# Altium footprint library CONN_HDR_1.00MM_ST_SMD.PcbLib: 42 footprints (part 2 of 3)
Each footprint in its own frame and in the unit in brackets; x right, y up, seen from the top. Pads: shape width x height; smd on the part's side, far side on the other; paste and mask are expansions set on the pad; w line width, h text height; cw(c..) or ccw(c..) is an arc to the next point about the centre after c.
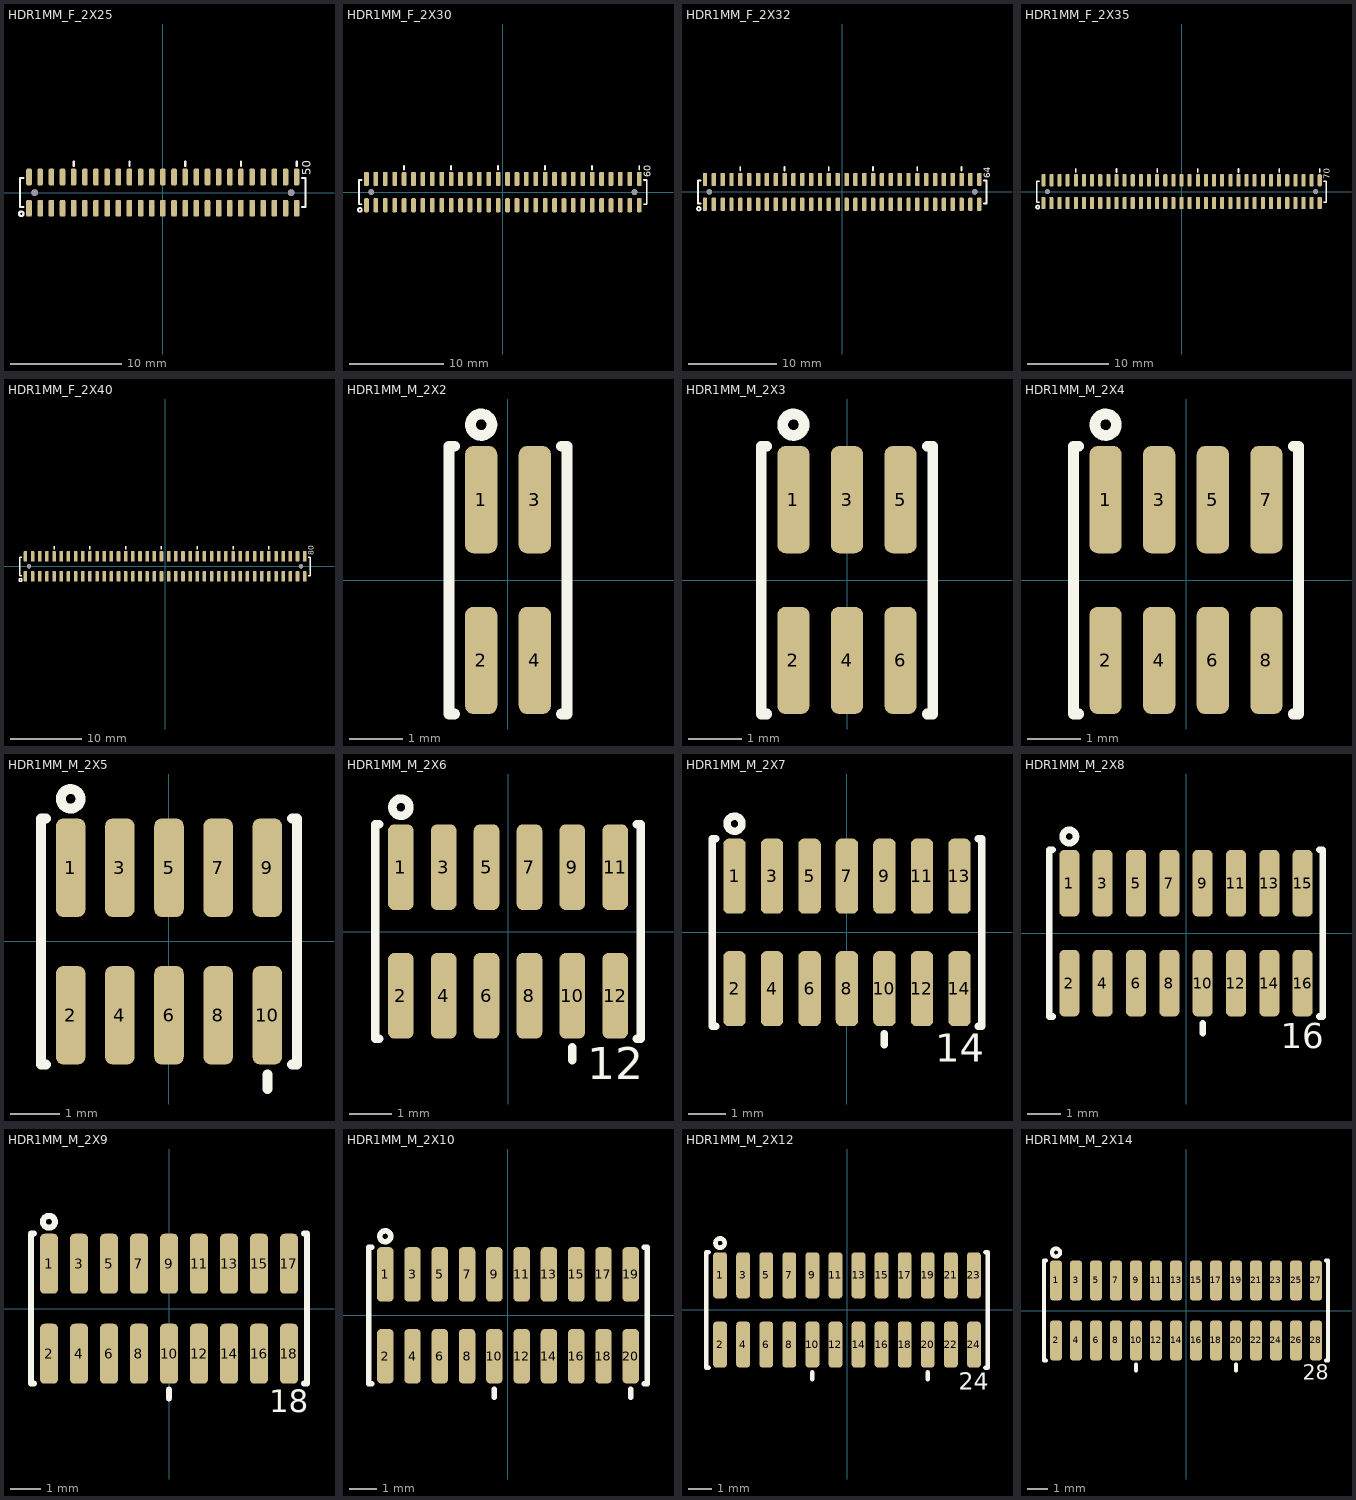
[diagram p1: the footprints below, top view; thin cyan lines are the x and y axes]

## HDR1MM_F_2X25 [mm] "HEADER, 1mm, SMD, GCT CO BC084 and BC085"
pads (52):
  rrect50% 0.5x1.5 smd mask+0.075: 1(-12,-1.4) 2(-12,1.4) 3(-11,-1.4) 4(-11,1.4) 5(-10,-1.4) 6(-10,1.4) 7(-9,-1.4) 8(-9,1.4) 9(-8,-1.4) 10(-8,1.4) 11(-7,-1.4) 12(-7,1.4) 13(-6,-1.4) 14(-6,1.4) 15(-5,-1.4) 16(-5,1.4) 17(-4,-1.4) 18(-4,1.4) 19(-3,-1.4) 20(-3,1.4) 21(-2,-1.4) 22(-2,1.4) 23(-1,-1.4) 24(-1,1.4) 25(0,-1.4) 26(0,1.4) 27(1,-1.4) 28(1,1.4) 29(2,-1.4) 30(2,1.4) 31(3,-1.4) 32(3,1.4) 33(4,-1.4) 34(4,1.4) 35(5,-1.4) 36(5,1.4) 37(6,-1.4) 38(6,1.4) 39(7,-1.4) 40(7,1.4) 41(8,-1.4) 42(8,1.4) 43(9,-1.4) 44(9,1.4) 45(10,-1.4) 46(10,1.4) 47(11,-1.4) 48(11,1.4) 49(12,-1.4) 50(12,1.4)
  round 0.6 hole 0.6 unplated: ""(-11.5,0) ""(11.5,0)
Top Overlay:
  circle w0.2: c-12.7,-1.9 r0.2
  lines w0.2: -12.5,-1.3 -12.8,-1.3 -12.8,1.3 -12.5,1.3 ; -8,2.4 -8,2.8 ; -3,2.4 -3,2.8 ; 2,2.4 2,2.8 ; 7,2.4 7,2.8 ; 12,2.4 12,2.8 ; 12.5,-1.3 12.8,-1.3 12.8,1.3 12.5,1.3
  text "50" at 13.25,1.55 h0.75
3D body "BC084-50-A-0390-L-C.stp": height 2.3, standoff -0.5, extent -12.75,-1.95 12.75,1.95

## HDR1MM_F_2X30 [mm] "HEADER, 1mm, SMD, GCT CO BC084 and BC085"
pads (62):
  rrect50% 0.5x1.5 smd mask+0.075: 1(-14.5,-1.4) 2(-14.5,1.4) 3(-13.5,-1.4) 4(-13.5,1.4) 5(-12.5,-1.4) 6(-12.5,1.4) 7(-11.5,-1.4) 8(-11.5,1.4) 9(-10.5,-1.4) 10(-10.5,1.4) 11(-9.5,-1.4) 12(-9.5,1.4) 13(-8.5,-1.4) 14(-8.5,1.4) 15(-7.5,-1.4) 16(-7.5,1.4) 17(-6.5,-1.4) 18(-6.5,1.4) 19(-5.5,-1.4) 20(-5.5,1.4) 21(-4.5,-1.4) 22(-4.5,1.4) 23(-3.5,-1.4) 24(-3.5,1.4) 25(-2.5,-1.4) 26(-2.5,1.4) 27(-1.5,-1.4) 28(-1.5,1.4) 29(-0.5,-1.4) 30(-0.5,1.4) 31(0.5,-1.4) 32(0.5,1.4) 33(1.5,-1.4) 34(1.5,1.4) 35(2.5,-1.4) 36(2.5,1.4) 37(3.5,-1.4) 38(3.5,1.4) 39(4.5,-1.4) 40(4.5,1.4) 41(5.5,-1.4) 42(5.5,1.4) 43(6.5,-1.4) 44(6.5,1.4) 45(7.5,-1.4) 46(7.5,1.4) 47(8.5,-1.4) 48(8.5,1.4) 49(9.5,-1.4) 50(9.5,1.4) 51(10.5,-1.4) 52(10.5,1.4) 53(11.5,-1.4) 54(11.5,1.4) 55(12.5,-1.4) 56(12.5,1.4) 57(13.5,-1.4) 58(13.5,1.4) 59(14.5,-1.4) 60(14.5,1.4)
  round 0.6 hole 0.6 unplated: ""(-14,0) ""(14,0)
Top Overlay:
  circle w0.2: c-15.2,-1.9 r0.2
  lines w0.2: -15,-1.3 -15.3,-1.3 -15.3,1.3 -15,1.3 ; -10.5,2.4 -10.5,2.8 ; -5.5,2.4 -5.5,2.8 ; -0.5,2.4 -0.5,2.8 ; 4.5,2.4 4.5,2.8 ; 9.5,2.4 9.5,2.8 ; 14.5,2.4 14.5,2.8 ; 15,-1.3 15.3,-1.3 15.3,1.3 15,1.3
  text "60" at 15.75,1.55 h0.75
3D body "BC084-60-A-0390-L-C.stp": height 2.3, standoff -0.5, extent -15.25,-1.95 15.25,1.95

## HDR1MM_F_2X32 [mm] "HEADER, 1mm, SMD, GCT CO BC084 and BC085"
pads (66):
  rrect50% 0.5x1.5 smd mask+0.075: 1(-15.5,-1.4) 2(-15.5,1.4) 3(-14.5,-1.4) 4(-14.5,1.4) 5(-13.5,-1.4) 6(-13.5,1.4) 7(-12.5,-1.4) 8(-12.5,1.4) 9(-11.5,-1.4) 10(-11.5,1.4) 11(-10.5,-1.4) 12(-10.5,1.4) 13(-9.5,-1.4) 14(-9.5,1.4) 15(-8.5,-1.4) 16(-8.5,1.4) 17(-7.5,-1.4) 18(-7.5,1.4) 19(-6.5,-1.4) 20(-6.5,1.4) 21(-5.5,-1.4) 22(-5.5,1.4) 23(-4.5,-1.4) 24(-4.5,1.4) 25(-3.5,-1.4) 26(-3.5,1.4) 27(-2.5,-1.4) 28(-2.5,1.4) 29(-1.5,-1.4) 30(-1.5,1.4) 31(-0.5,-1.4) 32(-0.5,1.4) 33(0.5,-1.4) 34(0.5,1.4) 35(1.5,-1.4) 36(1.5,1.4) 37(2.5,-1.4) 38(2.5,1.4) 39(3.5,-1.4) 40(3.5,1.4) 41(4.5,-1.4) 42(4.5,1.4) 43(5.5,-1.4) 44(5.5,1.4) 45(6.5,-1.4) 46(6.5,1.4) 47(7.5,-1.4) 48(7.5,1.4) 49(8.5,-1.4) 50(8.5,1.4) 51(9.5,-1.4) 52(9.5,1.4) 53(10.5,-1.4) 54(10.5,1.4) 55(11.5,-1.4) 56(11.5,1.4) 57(12.5,-1.4) 58(12.5,1.4) 59(13.5,-1.4) 60(13.5,1.4) 61(14.5,-1.4) 62(14.5,1.4) 63(15.5,-1.4) 64(15.5,1.4)
  round 0.6 hole 0.6 unplated: ""(-15,0) ""(15,0)
Top Overlay:
  circle w0.2: c-16.2,-1.9 r0.2
  lines w0.2: -16,-1.3 -16.3,-1.3 -16.3,1.3 -16,1.3 ; -11.5,2.4 -11.5,2.8 ; -6.5,2.4 -6.5,2.8 ; -1.5,2.4 -1.5,2.8 ; 3.5,2.4 3.5,2.8 ; 8.5,2.4 8.5,2.8 ; 13.5,2.4 13.5,2.8 ; 16,-1.3 16.3,-1.3 16.3,1.3 16,1.3
  text "64" at 16.75,1.55 h0.75
3D body "BC084-64-A-0390-L-C.stp": height 2.3, standoff -0.5, extent -16.25,-1.95 16.25,1.95

## HDR1MM_F_2X35 [mm] "HEADER, 1mm, SMD, GCT CO BC084 and BC085"
pads (72):
  rrect50% 0.5x1.5 smd mask+0.075: 1(-17,-1.4) 2(-17,1.4) 3(-16,-1.4) 4(-16,1.4) 5(-15,-1.4) 6(-15,1.4) 7(-14,-1.4) 8(-14,1.4) 9(-13,-1.4) 10(-13,1.4) 11(-12,-1.4) 12(-12,1.4) 13(-11,-1.4) 14(-11,1.4) 15(-10,-1.4) 16(-10,1.4) 17(-9,-1.4) 18(-9,1.4) 19(-8,-1.4) 20(-8,1.4) 21(-7,-1.4) 22(-7,1.4) 23(-6,-1.4) 24(-6,1.4) 25(-5,-1.4) 26(-5,1.4) 27(-4,-1.4) 28(-4,1.4) 29(-3,-1.4) 30(-3,1.4) 31(-2,-1.4) 32(-2,1.4) 33(-1,-1.4) 34(-1,1.4) 35(0,-1.4) 36(0,1.4) 37(1,-1.4) 38(1,1.4) 39(2,-1.4) 40(2,1.4) 41(3,-1.4) 42(3,1.4) 43(4,-1.4) 44(4,1.4) 45(5,-1.4) 46(5,1.4) 47(6,-1.4) 48(6,1.4) 49(7,-1.4) 50(7,1.4) 51(8,-1.4) 52(8,1.4) 53(9,-1.4) 54(9,1.4) 55(10,-1.4) 56(10,1.4) 57(11,-1.4) 58(11,1.4) 59(12,-1.4) 60(12,1.4) 61(13,-1.4) 62(13,1.4) 63(14,-1.4) 64(14,1.4) 65(15,-1.4) 66(15,1.4) 67(16,-1.4) 68(16,1.4) 69(17,-1.4) 70(17,1.4)
  round 0.6 hole 0.6 unplated: ""(-16.5,0) ""(16.5,0)
Top Overlay:
  circle w0.2: c-17.7,-1.9 r0.2
  lines w0.2: -17.5,-1.3 -17.8,-1.3 -17.8,1.3 -17.5,1.3 ; -13,2.4 -13,2.8 ; -8,2.4 -8,2.8 ; -3,2.4 -3,2.8 ; 2,2.4 2,2.8 ; 7,2.4 7,2.8 ; 12,2.4 12,2.8 ; 17,2.4 17,2.8 ; 17.5,-1.3 17.8,-1.3 17.8,1.3 17.5,1.3
  text "70" at 18.25,1.55 h0.75
3D body "BC084-70-A-0390-L-C.stp": height 2.3, standoff -0.5, extent -17.75,-1.95 17.75,1.95

## HDR1MM_F_2X40 [mm] "HEADER, 1mm, SMD, GCT CO BC084 and BC085"
pads (82):
  rrect50% 0.5x1.5 smd mask+0.075: 1(-19.5,-1.4) 2(-19.5,1.4) 3(-18.5,-1.4) 4(-18.5,1.4) 5(-17.5,-1.4) 6(-17.5,1.4) 7(-16.5,-1.4) 8(-16.5,1.4) 9(-15.5,-1.4) 10(-15.5,1.4) 11(-14.5,-1.4) 12(-14.5,1.4) 13(-13.5,-1.4) 14(-13.5,1.4) 15(-12.5,-1.4) 16(-12.5,1.4) 17(-11.5,-1.4) 18(-11.5,1.4) 19(-10.5,-1.4) 20(-10.5,1.4) 21(-9.5,-1.4) 22(-9.5,1.4) 23(-8.5,-1.4) 24(-8.5,1.4) 25(-7.5,-1.4) 26(-7.5,1.4) 27(-6.5,-1.4) 28(-6.5,1.4) 29(-5.5,-1.4) 30(-5.5,1.4) 31(-4.5,-1.4) 32(-4.5,1.4) 33(-3.5,-1.4) 34(-3.5,1.4) 35(-2.5,-1.4) 36(-2.5,1.4) 37(-1.5,-1.4) 38(-1.5,1.4) 39(-0.5,-1.4) 40(-0.5,1.4) 41(0.5,-1.4) 42(0.5,1.4) 43(1.5,-1.4) 44(1.5,1.4) 45(2.5,-1.4) 46(2.5,1.4) 47(3.5,-1.4) 48(3.5,1.4) 49(4.5,-1.4) 50(4.5,1.4) 51(5.5,-1.4) 52(5.5,1.4) 53(6.5,-1.4) 54(6.5,1.4) 55(7.5,-1.4) 56(7.5,1.4) 57(8.5,-1.4) 58(8.5,1.4) 59(9.5,-1.4) 60(9.5,1.4) 61(10.5,-1.4) 62(10.5,1.4) 63(11.5,-1.4) 64(11.5,1.4) 65(12.5,-1.4) 66(12.5,1.4) 67(13.5,-1.4) 68(13.5,1.4) 69(14.5,-1.4) 70(14.5,1.4) 71(15.5,-1.4) 72(15.5,1.4) 73(16.5,-1.4) 74(16.5,1.4) 75(17.5,-1.4) 76(17.5,1.4) 77(18.5,-1.4) 78(18.5,1.4) 79(19.5,-1.4) 80(19.5,1.4)
  round 0.6 hole 0.6 unplated: ""(-19,0) ""(19,0)
Top Overlay:
  circle w0.2: c-20.2,-1.9 r0.2
  lines w0.2: -20,-1.3 -20.3,-1.3 -20.3,1.3 -20,1.3 ; -15.5,2.4 -15.5,2.8 ; -10.5,2.4 -10.5,2.8 ; -5.5,2.4 -5.5,2.8 ; -0.5,2.4 -0.5,2.8 ; 4.5,2.4 4.5,2.8 ; 9.5,2.4 9.5,2.8 ; 14.5,2.4 14.5,2.8 ; 20,-1.3 20.3,-1.3 20.3,1.3 20,1.3
  text "80" at 20.75,1.55 h0.75
3D body "BC084-80-A-0390-L-C.stp": height 2.3, standoff -0.5, extent -20.25,-1.95 20.25,1.95

## HDR1MM_M_2X2 [mm] "HEADER, 1mm, SMD"
pads (4):
  rrect50% 0.6x2 smd mask+0.075: 1(-0.5,1.5) 2(-0.5,-1.5) 3(0.5,1.5) 4(0.5,-1.5)
Top Overlay:
  circle w0.2: c-0.5,2.9 r0.2
  lines w0.2: -1,-2.5 -1.1,-2.5 -1.1,2.5 -1,2.5 ; 1,-2.5 1.1,-2.5 1.1,2.5 1,2.5
3D body "BC050-04A-K0-0200-0160-0480-LB.stp": height 3.6, standoff 0, extent -1,-2.4 1,2.4

## HDR1MM_M_2X3 [mm] "HEADER, 1mm, SMD"
pads (6):
  rrect50% 0.6x2 smd mask+0.075: 1(-1,1.5) 2(-1,-1.5) 3(0,1.5) 4(0,-1.5) 5(1,1.5) 6(1,-1.5)
Top Overlay:
  circle w0.2: c-1,2.9 r0.2
  lines w0.2: -1.5,-2.5 -1.6,-2.5 -1.6,2.5 -1.5,2.5 ; 1.5,-2.5 1.6,-2.5 1.6,2.5 1.5,2.5
3D body "BC050-06A-K0-0200-0160-0480-LB.stp": height 3.6, standoff 0, extent -1.5,-2.4 1.5,2.4

## HDR1MM_M_2X4 [mm] "HEADER, 1mm, SMD"
pads (8):
  rrect50% 0.6x2 smd mask+0.075: 1(-1.5,1.5) 2(-1.5,-1.5) 3(-0.5,1.5) 4(-0.5,-1.5) 5(0.5,1.5) 6(0.5,-1.5) 7(1.5,1.5) 8(1.5,-1.5)
Top Overlay:
  circle w0.2: c-1.5,2.9 r0.2
  lines w0.2: -2,-2.5 -2.1,-2.5 -2.1,2.5 -2,2.5 ; 2,-2.5 2.1,-2.5 2.1,2.5 2,2.5
3D body "BC050-08A-K0-0200-0160-0480-LB.stp": height 3.6, standoff 0, extent -2,-2.4 2,2.4

## HDR1MM_M_2X5 [mm] "HEADER, 1mm, SMD"
pads (10):
  rrect50% 0.6x2 smd mask+0.075: 1(-2,1.5) 2(-2,-1.5) 3(-1,1.5) 4(-1,-1.5) 5(0,1.5) 6(0,-1.5) 7(1,1.5) 8(1,-1.5) 9(2,1.5) 10(2,-1.5)
Top Overlay:
  circle w0.2: c-2,2.9 r0.2
  lines w0.2: -2.5,-2.5 -2.6,-2.5 -2.6,2.5 -2.5,2.5 ; 2,-3 2,-2.7 ; 2.5,-2.5 2.6,-2.5 2.6,2.5 2.5,2.5
3D body "BC050-10A-K0-0200-0160-0480-LB.stp": height 3.6, standoff 0, extent -2.5,-2.4 2.5,2.4

## HDR1MM_M_2X6 [mm] "HEADER, 1mm, SMD"
pads (12):
  rrect50% 0.6x2 smd mask+0.075: 1(-2.5,1.5) 2(-2.5,-1.5) 3(-1.5,1.5) 4(-1.5,-1.5) 5(-0.5,1.5) 6(-0.5,-1.5) 7(0.5,1.5) 8(0.5,-1.5) 9(1.5,1.5) 10(1.5,-1.5) 11(2.5,1.5) 12(2.5,-1.5)
Top Overlay:
  circle w0.2: c-2.5,2.9 r0.2
  lines w0.2: -3,-2.5 -3.1,-2.5 -3.1,2.5 -3,2.5 ; 1.5,-3 1.5,-2.7 ; 3,-2.5 3.1,-2.5 3.1,2.5 3,2.5
  text "12" at 1.85,-3.45 h0.75
3D body "BC050-12A-K0-0200-0160-0480-LB.stp": height 3.6, standoff 0, extent -3,-2.4 3,2.4

## HDR1MM_M_2X7 [mm] "HEADER, 1mm, SMD"
pads (14):
  rrect50% 0.6x2 smd mask+0.075: 1(-3,1.5) 2(-3,-1.5) 3(-2,1.5) 4(-2,-1.5) 5(-1,1.5) 6(-1,-1.5) 7(0,1.5) 8(0,-1.5) 9(1,1.5) 10(1,-1.5) 11(2,1.5) 12(2,-1.5) 13(3,1.5) 14(3,-1.5)
Top Overlay:
  circle w0.2: c-3,2.9 r0.2
  lines w0.2: -3.5,-2.5 -3.6,-2.5 -3.6,2.5 -3.5,2.5 ; 1,-3 1,-2.7 ; 3.5,-2.5 3.6,-2.5 3.6,2.5 3.5,2.5
  text "14" at 2.35,-3.45 h0.75
3D body "BC050-14A-K0-0200-0160-0480-LB.stp": height 3.6, standoff 0, extent -3.5,-2.4 3.5,2.4

## HDR1MM_M_2X8 [mm] "HEADER, 1mm, SMD"
pads (16):
  rrect50% 0.6x2 smd mask+0.075: 1(-3.5,1.5) 2(-3.5,-1.5) 3(-2.5,1.5) 4(-2.5,-1.5) 5(-1.5,1.5) 6(-1.5,-1.5) 7(-0.5,1.5) 8(-0.5,-1.5) 9(0.5,1.5) 10(0.5,-1.5) 11(1.5,1.5) 12(1.5,-1.5) 13(2.5,1.5) 14(2.5,-1.5) 15(3.5,1.5) 16(3.5,-1.5)
Top Overlay:
  circle w0.2: c-3.5,2.9 r0.2
  lines w0.2: -4,-2.5 -4.1,-2.5 -4.1,2.5 -4,2.5 ; 0.5,-3 0.5,-2.7 ; 4,-2.5 4.1,-2.5 4.1,2.5 4,2.5
  text "16" at 2.85,-3.45 h0.75
3D body "BC050-16A-K0-0200-0160-0480-LB.stp": height 3.6, standoff 0, extent -4,-2.4 4,2.4

## HDR1MM_M_2X9 [mm] "HEADER, 1mm, SMD"
pads (18):
  rrect50% 0.6x2 smd mask+0.075: 1(-4,1.5) 2(-4,-1.5) 3(-3,1.5) 4(-3,-1.5) 5(-2,1.5) 6(-2,-1.5) 7(-1,1.5) 8(-1,-1.5) 9(0,1.5) 10(0,-1.5) 11(1,1.5) 12(1,-1.5) 13(2,1.5) 14(2,-1.5) 15(3,1.5) 16(3,-1.5) 17(4,1.5) 18(4,-1.5)
Top Overlay:
  circle w0.2: c-4,2.9 r0.2
  lines w0.2: -4.5,-2.5 -4.6,-2.5 -4.6,2.5 -4.5,2.5 ; 0,-3 0,-2.7 ; 4.5,-2.5 4.6,-2.5 4.6,2.5 4.5,2.5
  text "18" at 3.35,-3.45 h0.75
3D body "BC050-18A-K0-0200-0160-0480-LB.stp": height 3.6, standoff 0, extent -4.5,-2.4 4.5,2.4

## HDR1MM_M_2X10 [mm] "HEADER, 1mm, SMD"
pads (20):
  rrect50% 0.6x2 smd mask+0.075: 1(-4.5,1.5) 2(-4.5,-1.5) 3(-3.5,1.5) 4(-3.5,-1.5) 5(-2.5,1.5) 6(-2.5,-1.5) 7(-1.5,1.5) 8(-1.5,-1.5) 9(-0.5,1.5) 10(-0.5,-1.5) 11(0.5,1.5) 12(0.5,-1.5) 13(1.5,1.5) 14(1.5,-1.5) 15(2.5,1.5) 16(2.5,-1.5) 17(3.5,1.5) 18(3.5,-1.5) 19(4.5,1.5) 20(4.5,-1.5)
Top Overlay:
  circle w0.2: c-4.5,2.9 r0.2
  lines w0.2: -5,-2.5 -5.1,-2.5 -5.1,2.5 -5,2.5 ; -0.5,-3 -0.5,-2.7 ; 4.5,-3 4.5,-2.7 ; 5,-2.5 5.1,-2.5 5.1,2.5 5,2.5
3D body "BC050-20A-K0-0200-0160-0480-LB.stp": height 3.6, standoff 0, extent -5,-2.4 5,2.4

## HDR1MM_M_2X12 [mm] "HEADER, 1mm, SMD"
pads (24):
  rrect50% 0.6x2 smd mask+0.075: 1(-5.5,1.5) 2(-5.5,-1.5) 3(-4.5,1.5) 4(-4.5,-1.5) 5(-3.5,1.5) 6(-3.5,-1.5) 7(-2.5,1.5) 8(-2.5,-1.5) 9(-1.5,1.5) 10(-1.5,-1.5) 11(-0.5,1.5) 12(-0.5,-1.5) 13(0.5,1.5) 14(0.5,-1.5) 15(1.5,1.5) 16(1.5,-1.5) 17(2.5,1.5) 18(2.5,-1.5) 19(3.5,1.5) 20(3.5,-1.5) 21(4.5,1.5) 22(4.5,-1.5) 23(5.5,1.5) 24(5.5,-1.5)
Top Overlay:
  circle w0.2: c-5.5,2.9 r0.2
  lines w0.2: -6,-2.5 -6.1,-2.5 -6.1,2.5 -6,2.5 ; -1.5,-3 -1.5,-2.7 ; 3.5,-3 3.5,-2.7 ; 6,-2.5 6.1,-2.5 6.1,2.5 6,2.5
  text "24" at 4.85,-3.45 h0.75
3D body "BC050-24A-K0-0200-0160-0480-LB.stp": height 3.6, standoff 0, extent -6,-2.4 6,2.4

## HDR1MM_M_2X14 [mm] "HEADER, 1mm, SMD"
pads (28):
  rrect50% 0.6x2 smd mask+0.075: 1(-6.5,1.5) 2(-6.5,-1.5) 3(-5.5,1.5) 4(-5.5,-1.5) 5(-4.5,1.5) 6(-4.5,-1.5) 7(-3.5,1.5) 8(-3.5,-1.5) 9(-2.5,1.5) 10(-2.5,-1.5) 11(-1.5,1.5) 12(-1.5,-1.5) 13(-0.5,1.5) 14(-0.5,-1.5) 15(0.5,1.5) 16(0.5,-1.5) 17(1.5,1.5) 18(1.5,-1.5) 19(2.5,1.5) 20(2.5,-1.5) 21(3.5,1.5) 22(3.5,-1.5) 23(4.5,1.5) 24(4.5,-1.5) 25(5.5,1.5) 26(5.5,-1.5) 27(6.5,1.5) 28(6.5,-1.5)
Top Overlay:
  circle w0.2: c-6.5,2.9 r0.2
  lines w0.2: -7,-2.5 -7.1,-2.5 -7.1,2.5 -7,2.5 ; -2.5,-3 -2.5,-2.7 ; 2.5,-3 2.5,-2.7 ; 7,-2.5 7.1,-2.5 7.1,2.5 7,2.5
  text "28" at 5.85,-3.45 h0.75
3D body "BC050-28A-K0-0200-0160-0480-LB.stp": height 3.6, standoff 0, extent -7,-2.4 7,2.4